# Altium footprint library IC.PcbLib: 386 footprints (part 24 of 30)
Each footprint in its own frame and in the unit in brackets; x right, y up, seen from the top. Pads: shape width x height; smd on the part's side, far side on the other; paste and mask are expansions set on the pad; w line width, h text height; cw(c..) or ccw(c..) is an arc to the next point about the centre after c.
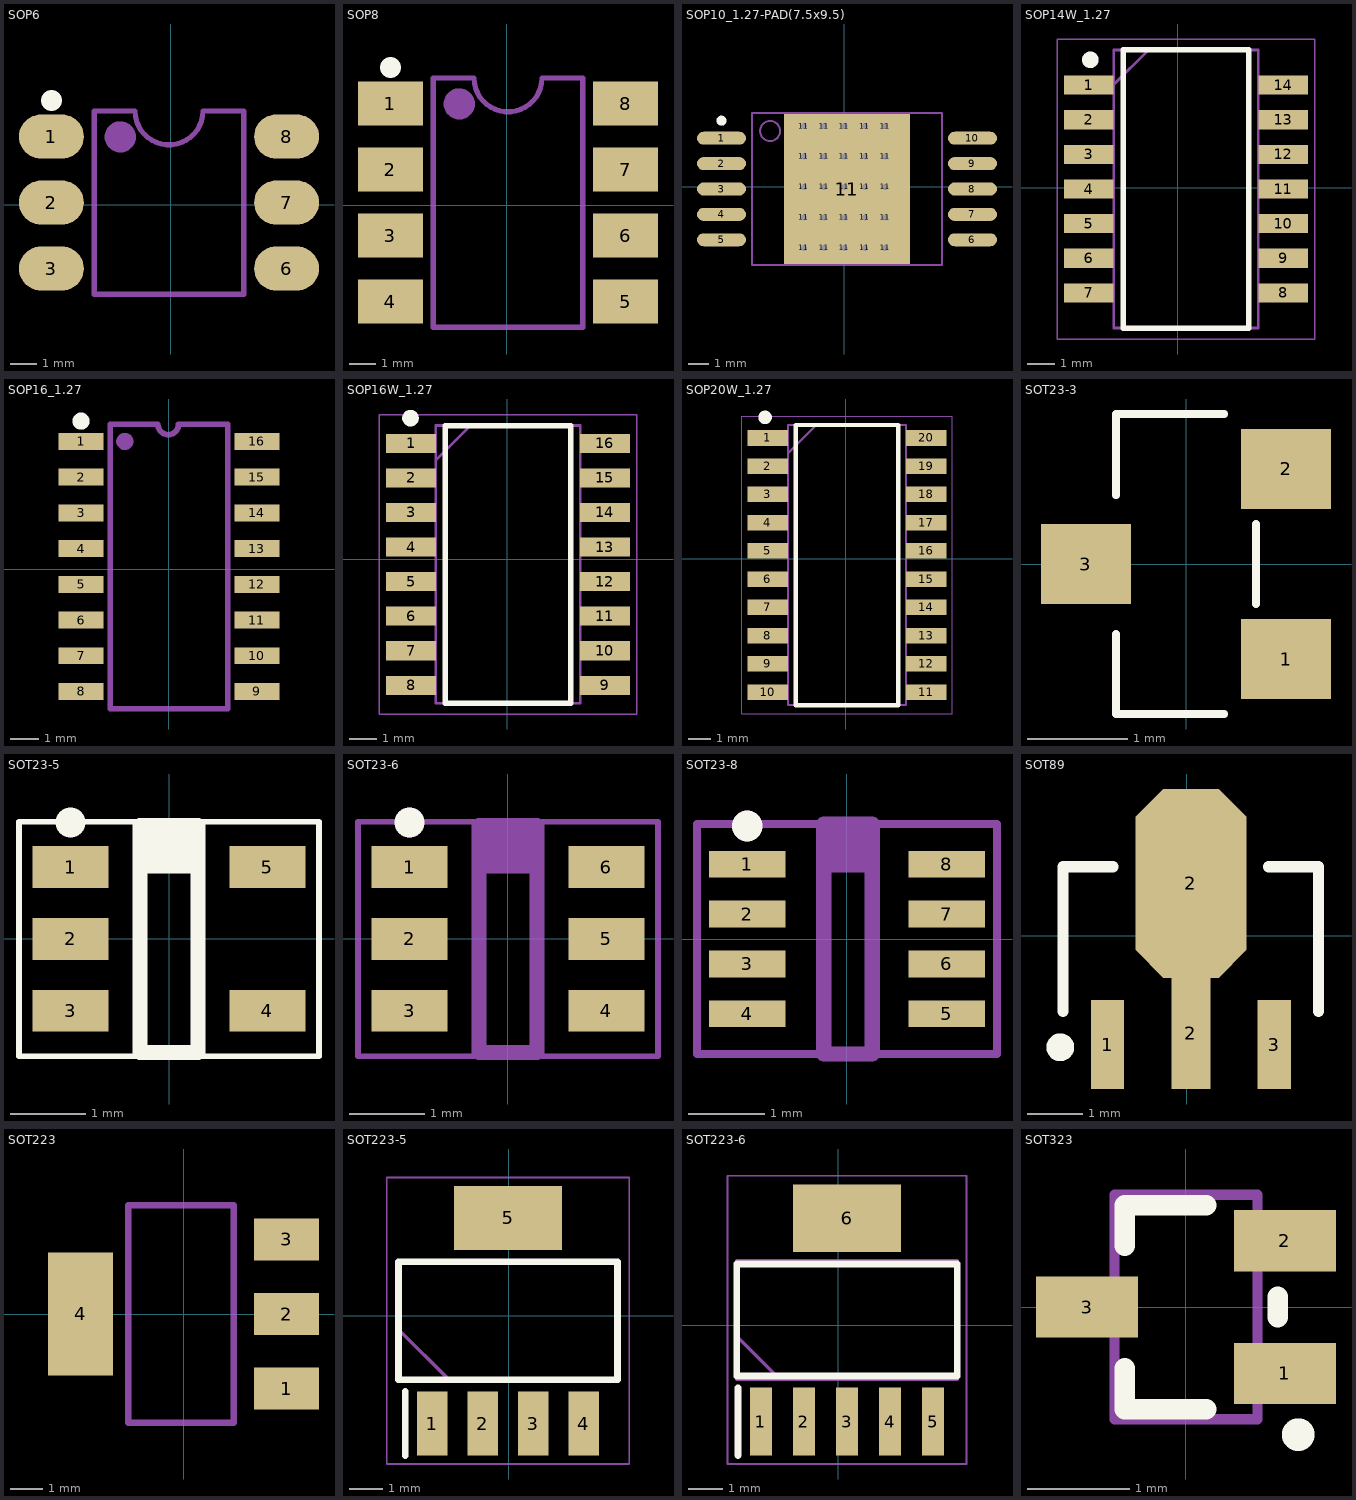
[diagram p23: the footprints below, top view; thin cyan lines are the x and y axes]

## SOP6 [mm]
pads (6):
  oval 2.5x1.7 smd: 1(-4.601,2.616) 2(-4.601,0.076) 3(-4.601,-2.464) 6(4.449,-2.464) 7(4.449,0.076) 8(4.449,2.616)
Top Overlay:
  lines w0.8: -4.602,4.006 -4.601,4.005
Mechanical 15:
  circle w0.6: c-1.951,2.606 r0.3
  lines w0.2: -2.951,-3.454 2.799,-3.454 2.799,3.606 1.231,3.606 cw(c-0.076,3.606) -1.384,3.606 -2.951,3.606 -2.951,-3.454
3D body "SMD_6.STEP": height 3.58, standoff -0.03, extent -5.156,-3.529 5.004,3.761

## SOP8 [mm]
pads (8):
  rect 2.5x1.7 smd: 1(-4.474,3.912) 2(-4.474,1.372) 3(-4.474,-1.168) 4(-4.474,-3.708) 5(4.576,-3.708) 6(4.576,-1.168) 7(4.576,1.372) 8(4.576,3.912)
Top Overlay:
  lines w0.8: -4.475,5.301 -4.474,5.3
Mechanical 15:
  circle w0.6: c-1.824,3.902 r0.3
  lines w0.2: -2.824,-4.698 -2.824,4.902 -1.257,4.902 ccw(c0.051,4.902) 1.358,4.902 2.926,4.902 2.926,-4.698 -2.824,-4.698
3D body "ISO1050DUB.stp": height 4.85, standoff 0, extent -4.844,-4.674 5.556,4.826

## SOP10_1.27-PAD(7.5x9.5) [mm]
pads (36):
  oval 2.45x0.65 smd: 1(-6.148,2.438) 2(-6.148,1.168) 3(-6.148,-0.102) 4(-6.148,-1.372) 5(-6.148,-2.642) 6(6.402,-2.642) 7(6.402,-1.372) 8(6.402,-0.102) 9(6.402,1.168) 10(6.402,2.438)
  round 0.6 hole 0.3: 11(-2.032,-3.048) 11(-2.032,-1.524) 11(-2.032,0) 11(-2.032,1.524) 11(-2.032,3.048) 11(-1.016,-3.048) 11(-1.016,-1.524) 11(-1.016,0) 11(-1.016,1.524) 11(-1.016,3.048) 11(0,-3.048) 11(0,-1.524) 11(0,0) 11(0,1.524) 11(0,3.048) 11(1.016,-3.048) 11(1.016,-1.524) 11(1.016,0) 11(1.016,1.524) 11(1.016,3.048) 11(2.032,-3.048) 11(2.032,-1.524) 11(2.032,0) 11(2.032,1.524) 11(2.032,3.048)
  rect 6.3x7.5 smd paste-3.15 mask+0.051: 11(0.127,-0.102)
Top Overlay:
  circle w0.25: c-6.148,3.313 r0.125
Top Paste:
  region: -0.611,-2.489 -0.611,-1.539 -1.635,-1.539 -1.635,-2.489
  region: 0.639,-2.489 0.639,-1.539 -0.385,-1.539 -0.385,-2.489
  region: 1.889,-2.489 1.889,-1.539 0.865,-1.539 0.865,-2.489
  region: -1.635,3.536 -1.635,2.586 -0.611,2.586 -0.611,3.536
  region: -0.385,3.536 -0.385,2.586 0.639,2.586 0.639,3.536
  region: 0.865,3.536 0.865,2.586 1.889,2.586 1.889,3.536
  region: 1.852,-1.202 1.852,-0.252 0.902,-0.252 0.902,-1.202
  region: 0.602,-1.202 0.602,-0.252 -0.348,-0.252 -0.348,-1.202
  region: -0.648,-1.202 -0.648,-0.252 -1.598,-0.252 -1.598,-1.202
  region: -0.648,0.048 -0.648,0.998 -1.598,0.998 -1.598,0.048
  rectangle: -1.598,1.298 -0.648,2.248
  region: 0.602,2.248 -0.348,2.248 -0.348,1.298 0.602,1.298
  rectangle: -2.923,0.048 -1.898,0.998
  rectangle: -2.923,1.298 -1.898,2.248
  rectangle: -2.923,2.548 -1.898,3.573
  rectangle: -2.923,0.048 -1.898,0.998
  rectangle: -2.923,-2.527 -1.898,-1.502
  rectangle: -2.923,-1.202 -1.898,-0.252
  region: 3.177,-0.252 2.152,-0.252 2.152,-1.202 3.177,-1.202
  region: 3.177,-1.502 2.152,-1.502 2.152,-2.527 3.177,-2.527
  region: 3.177,0.998 2.152,0.998 2.152,0.048 3.177,0.048
  region: 3.177,3.573 2.152,3.573 2.152,2.548 3.177,2.548
  region: 3.177,2.248 2.152,2.248 2.152,1.298 3.177,1.298
  region: 1.852,0.998 0.902,0.998 0.902,0.048 1.852,0.048
  region: 1.852,2.248 0.902,2.248 0.902,1.298 1.852,1.298
  rectangle: -0.348,0.048 0.602,0.998
  region: 3.177,-2.827 2.152,-2.827 2.152,-3.852 3.177,-3.852
  rectangle: -2.923,-3.852 -1.898,-2.827
  region: 1.889,-3.814 1.889,-2.864 0.865,-2.864 0.865,-3.814
  region: 0.639,-3.814 0.639,-2.864 -0.385,-2.864 -0.385,-3.814
  region: -0.611,-3.814 -0.611,-2.864 -1.635,-2.864 -1.635,-3.814
Mechanical 13:
  circle w0.1: c-3.723,2.798 r0.5
  lines w0.1: -4.623,-3.902 4.877,-3.902 4.877,3.698 -4.623,3.698 -4.623,-3.902
Mechanical 15:
  lines w0.1: -0.373,-0.102 0.627,-0.102 ; 0.127,-0.602 0.127,0.398
3D body "SOP127P1250X370_HS-11N.step": height 3.7, standoff 0, extent -6.098,-3.826 6.402,3.674

## SOP14W_1.27 [mm]
pads (14):
  rect 1.825x0.7 smd: 1(-3.257,3.759) 2(-3.257,2.489) 3(-3.257,1.219) 4(-3.257,-0.051) 5(-3.257,-1.321) 6(-3.257,-2.591) 7(-3.257,-3.861) 8(3.867,-3.861) 9(3.867,-2.591) 10(3.867,-1.321) 11(3.867,-0.051) 12(3.867,1.219) 13(3.867,2.489) 14(3.867,3.759)
Top Overlay:
  circle w0.305: c-3.202,4.686 r0.152
  lines w0.2: -1.995,-5.151 -1.995,5.049 2.605,5.049 2.605,-5.151 -1.995,-5.151
Mechanical 13:
  lines w0.1: -2.345,3.779 -1.075,5.049 ; -2.345,-5.151 -2.345,5.049 2.955,5.049 2.955,-5.151 -2.345,-5.151
Mechanical 15:
  lines w0.05: -4.42,-5.551 -4.42,5.449 5.03,5.449 5.03,-5.551 -4.42,-5.551
3D body "SN74HC08NSRG4.stp": height 2, standoff 0, extent -3.595,-5.151 4.205,5.049

## SOP16_1.27 [mm]
pads (16):
  rect 1.6x0.6 smd: 1(-3.126,4.547) 2(-3.126,3.277) 3(-3.126,2.007) 4(-3.126,0.737) 5(-3.126,-0.533) 6(-3.126,-1.803) 7(-3.126,-3.073) 8(-3.126,-4.343) 9(3.126,-4.343) 10(3.126,-3.073) 11(3.126,-1.803) 12(3.126,-0.533) 13(3.126,0.737) 14(3.126,2.007) 15(3.126,3.277) 16(3.126,4.547)
Top Overlay:
  circle w0.305: c-3.126,5.271 r0.152
Mechanical 15:
  circle w0.305: c-1.572,4.547 r0.152
  lines w0.2: 0.339,5.156 cw(c-0.027,5.156) -0.394,5.156 -2.083,5.156 -2.083,-4.953 2.083,-4.953 2.083,5.156 0.367,5.156
3D body "SOP16.STEP": height 2.1, standoff 0, extent -3.475,-5.074 3.525,5.226

## SOP16W_1.27 [mm]
pads (16):
  rect 1.825x0.7 smd: 1(-3.537,4.267) 2(-3.537,2.997) 3(-3.537,1.727) 4(-3.537,0.457) 5(-3.537,-0.813) 6(-3.537,-2.083) 7(-3.537,-3.353) 8(-3.537,-4.623) 9(3.587,-4.623) 10(3.587,-3.353) 11(3.587,-2.083) 12(3.587,-0.813) 13(3.587,0.457) 14(3.587,1.727) 15(3.587,2.997) 16(3.587,4.267)
Top Overlay:
  circle w0.305: c-3.558,5.194 r0.152
  lines w0.2: -2.275,-5.278 -2.275,4.922 2.325,4.922 2.325,-5.278 -2.275,-5.278
Mechanical 13:
  lines w0.1: -2.625,3.652 -1.355,4.922 ; -2.625,-5.278 -2.625,4.922 2.675,4.922 2.675,-5.278 -2.625,-5.278
Mechanical 15:
  lines w0.05: -4.7,-5.678 -4.7,5.322 4.75,5.322 4.75,-5.678 -4.7,-5.678
3D body "SN74HC139NSR.stp": height 2, standoff 0, extent -3.875,-5.278 3.925,4.922

## SOP20W_1.27 [mm]
pads (20):
  rect 1.825x0.7 smd: 1(-3.511,5.436) 2(-3.511,4.166) 3(-3.511,2.896) 4(-3.511,1.626) 5(-3.511,0.356) 6(-3.511,-0.914) 7(-3.511,-2.184) 8(-3.511,-3.454) 9(-3.511,-4.724) 10(-3.511,-5.994) 11(3.613,-5.994) 12(3.613,-4.724) 13(3.613,-3.454) 14(3.613,-2.184) 15(3.613,-0.914) 16(3.613,0.356) 17(3.613,1.626) 18(3.613,2.896) 19(3.613,4.166) 20(3.613,5.436)
Top Overlay:
  circle w0.305: c-3.634,6.363 r0.152
  lines w0.2: -2.249,-6.579 -2.249,6.021 2.351,6.021 2.351,-6.579 -2.249,-6.579
Mechanical 13:
  lines w0.1: -2.599,4.751 -1.329,6.021 ; -2.599,-6.579 -2.599,6.021 2.701,6.021 2.701,-6.579 -2.599,-6.579
Mechanical 15:
  lines w0.05: -4.674,-6.979 -4.674,6.421 4.776,6.421 4.776,-6.979 -4.674,-6.979
3D body "SN74LV244ANSR.stp": height 2, standoff 0, extent -3.849,-6.579 3.951,6.021

## SOT23-3 [mm]
pads (3):
  rect 0.9x0.8 smd: 1(1,-0.95) 2(1,0.95) 3(-1,0)
Top Overlay:
  lines w0.076: -0.7,-0.7 -0.7,-1.5 0.381,-1.5 ; -0.7,0.687 -0.7,1.5 0.381,1.5 ; 0.7,-0.4 0.7,0.4
3D body "SOT23-3.STEP": height 1.09, standoff 0, extent -1.25,-1.5 1.25,1.5

## SOT23-5 [mm] "SOT23, 5-Leads, Body 3.0x3.0mm (max), Pitch 0.95mm, IPC Medium Density"
height 1.45
pads (5):
  rect 1x0.55 smd: 1(-1.3,0.95) 2(-1.3,0) 3(-1.3,-0.95) 4(1.3,-0.95) 5(1.3,0.95)
Top Overlay:
  lines w0.076: -1.981,-1.55 1.981,-1.55 1.981,1.549 -1.981,1.549 -1.981,-1.55
  lines w0.2: -0.381,0.965 0.381,0.965 ; -0.381,1.143 0.381,1.143 ; -0.381,1.321 0.381,1.321 ; -0.381,-1.5 0.381,-1.5 0.381,1.5 -0.381,1.5 -0.381,-1.5
  lines w0.4: -1.3,1.54 -1.3,1.539
3D body "SOT23-5.STEP": height 1.45, standoff 0, extent -1.4,-1.45 1.4,1.45

## SOT23-6 [mm]
height 1.45
pads (6):
  rect 1x0.55 smd: 1(-1.3,0.95) 2(-1.3,0) 3(-1.3,-0.95) 4(1.3,-0.95) 5(1.3,0) 6(1.3,0.95)
Top Overlay:
  lines w0.4: -1.3,1.54 -1.3,1.539
Mechanical 15:
  lines w0.076: -1.981,-1.55 -1.981,1.549 1.981,1.549 1.981,-1.55 -1.981,-1.55
  lines w0.2: -0.381,0.965 0.381,0.965 ; -0.381,1.143 0.381,1.143 ; -0.381,1.321 0.381,1.321 ; -0.381,-1.5 0.381,-1.5 0.381,1.5 -0.381,1.5 -0.381,-1.5
  lines w0.4: -1.3,1.54 -1.3,1.539
3D body "SOT-23-6-1.STEP": height 1.44, standoff -0.02, extent -1.5,-1.5 1.5,1.5

## SOT23-8 [mm] "TSOP, 8-Leads, Body 2.9x1.6mm (max), Pitch 0.65mm, IPC Medium Density"
height 1.45
pads (8):
  rect 1x0.35 smd: 1(-1.3,0.975) 2(-1.3,0.325) 3(-1.3,-0.325) 4(-1.3,-0.975) 5(1.3,-0.975) 6(1.3,-0.325) 7(1.3,0.325) 8(1.3,0.975)
Top Overlay:
  lines w0.4: -1.301,1.474 -1.3,1.473
Mechanical 15:
  lines w0.1: -1.956,-1.499 -1.956,1.499 1.956,1.499 1.956,-1.499 -1.956,-1.499
  lines w0.2: -0.305,0.965 0.33,0.965 ; -0.305,1.143 0.33,1.143 ; -0.305,1.321 0.33,1.321 ; -0.305,-1.5 0.33,-1.5 0.33,1.5 -0.305,1.5 -0.305,-1.5
  lines w0.4: -1.301,1.474 -1.3,1.473
3D body "SOT23-8.STEP": height 1.2, standoff 0, extent -1.4,-1.495 1.4,1.445

## SOT89 [mm]
height 1.45
pads (4):
  rect 0.6x1.6 smd: 1(-1.424,-1.96) 3(1.576,-1.96)
  rect 0.7x2 smd: 2(0.076,-1.76)
  oct 2x3.4 smd: 2(0.076,0.94)
Top Overlay:
  circle w0.25: c-2.274,-2.01 r0.125
  lines w0.2: -2.224,-1.36 -2.224,1.24 -1.324,1.24 ; 1.476,1.24 2.376,1.24 2.376,-1.36
3D body "SOT-89.STEP": height -0.38, standoff -1.89, extent -2.174,-2.295 2.326,2.005

## SOT223 [mm]
pads (4):
  rect 2x1.3 smd: 1(3.179,-2.3) 2(3.179,0) 3(3.179,2.3)
  rect 2x3.8 smd: 4(-3.179,0)
Mechanical 15:
  lines w0.2: -1.704,-3.35 1.546,-3.35 1.546,3.35 -1.704,3.35 -1.704,-3.35
3D body "SOT223-4.STEP": height 1.64, standoff -0.01, extent -3.37,-3.256 3.63,3.244

## SOT223-5 [mm]
pads (5):
  rect 0.9x1.9 smd: 1(-2.275,-3.202) 2(-0.775,-3.202) 3(0.725,-3.202) 4(2.225,-3.202)
  rect 3.2x1.9 smd: 5(-0.025,2.898)
Top Overlay:
  lines w0.2: -3.075,-4.152 -3.075,-2.252 ; -3.275,-1.902 -3.275,1.598 3.225,1.598 3.225,-1.902 -3.275,-1.902
Mechanical 13:
  lines w0.1: -3.275,-0.407 -1.775,-1.907 ; -3.275,-1.907 -3.275,1.603 3.225,1.603 3.225,-1.907 -3.275,-1.907
Mechanical 15:
  lines w0.05: -3.625,-4.402 -3.625,4.098 3.575,4.098 3.575,-4.402 -3.625,-4.402
3D body "User Library-SOT223-5.step": height 1.7, standoff 0, extent -3.301,-3.633 3.199,3.327

## SOT223-6 [mm]
pads (6):
  rect 0.65x2 smd: 1(-2.286,-2.848) 2(-1.016,-2.848) 3(0.254,-2.848) 4(1.524,-2.848) 5(2.794,-2.848)
  rect 3.2x2 smd: 6(0.254,3.152)
Top Overlay:
  lines w0.2: -2.961,-3.848 -2.961,-1.848 ; -2.996,-1.498 -2.996,1.802 3.504,1.802 3.504,-1.498 -2.996,-1.498
Mechanical 13:
  lines w0.1: -2.996,-0.328 -1.726,-1.598 ; -2.996,-1.598 -2.996,1.902 3.504,1.902 3.504,-1.598 -2.996,-1.598
Mechanical 15:
  lines w0.05: -3.271,-4.098 -3.271,4.402 3.779,4.402 3.779,-4.098 -3.271,-4.098
3D body "User Library-SOT-223-6.step": height 1.8, standoff 0, extent -3.021,-3.376 3.529,3.884

## SOT323 [mm]
pads (3):
  rect 1x0.6 smd: 1(0.97,-0.65) 2(0.97,0.65) 3(-0.97,0)
Top Overlay:
  circle w0.25: c1.1,-1.25 r0.035
  lines w0.2: -0.6,-0.6 -0.6,-1 0.2,-1 ; -0.6,0.6 -0.6,1 0.2,1 ; 0.9,-0.1 0.9,0.1
Mechanical 13:
  lines w0.1: -0.7,-1.1 0.7,-1.1 0.7,1.1 -0.7,1.1 -0.7,-1.1
3D body "User Library-SOT323 (SC70-3)-1.STEP": height 1.1, standoff 0, extent -1.123,-1.1 1.122,1.1